# Altium footprint library Cyberdeck.PcbLib: 261 footprints (part 5 of 17)
Each footprint in its own frame and in the unit in brackets; x right, y up, seen from the top. Pads: shape width x height; smd on the part's side, far side on the other; paste and mask are expansions set on the pad; w line width, h text height; cw(c..) or ccw(c..) is an arc to the next point about the centre after c.
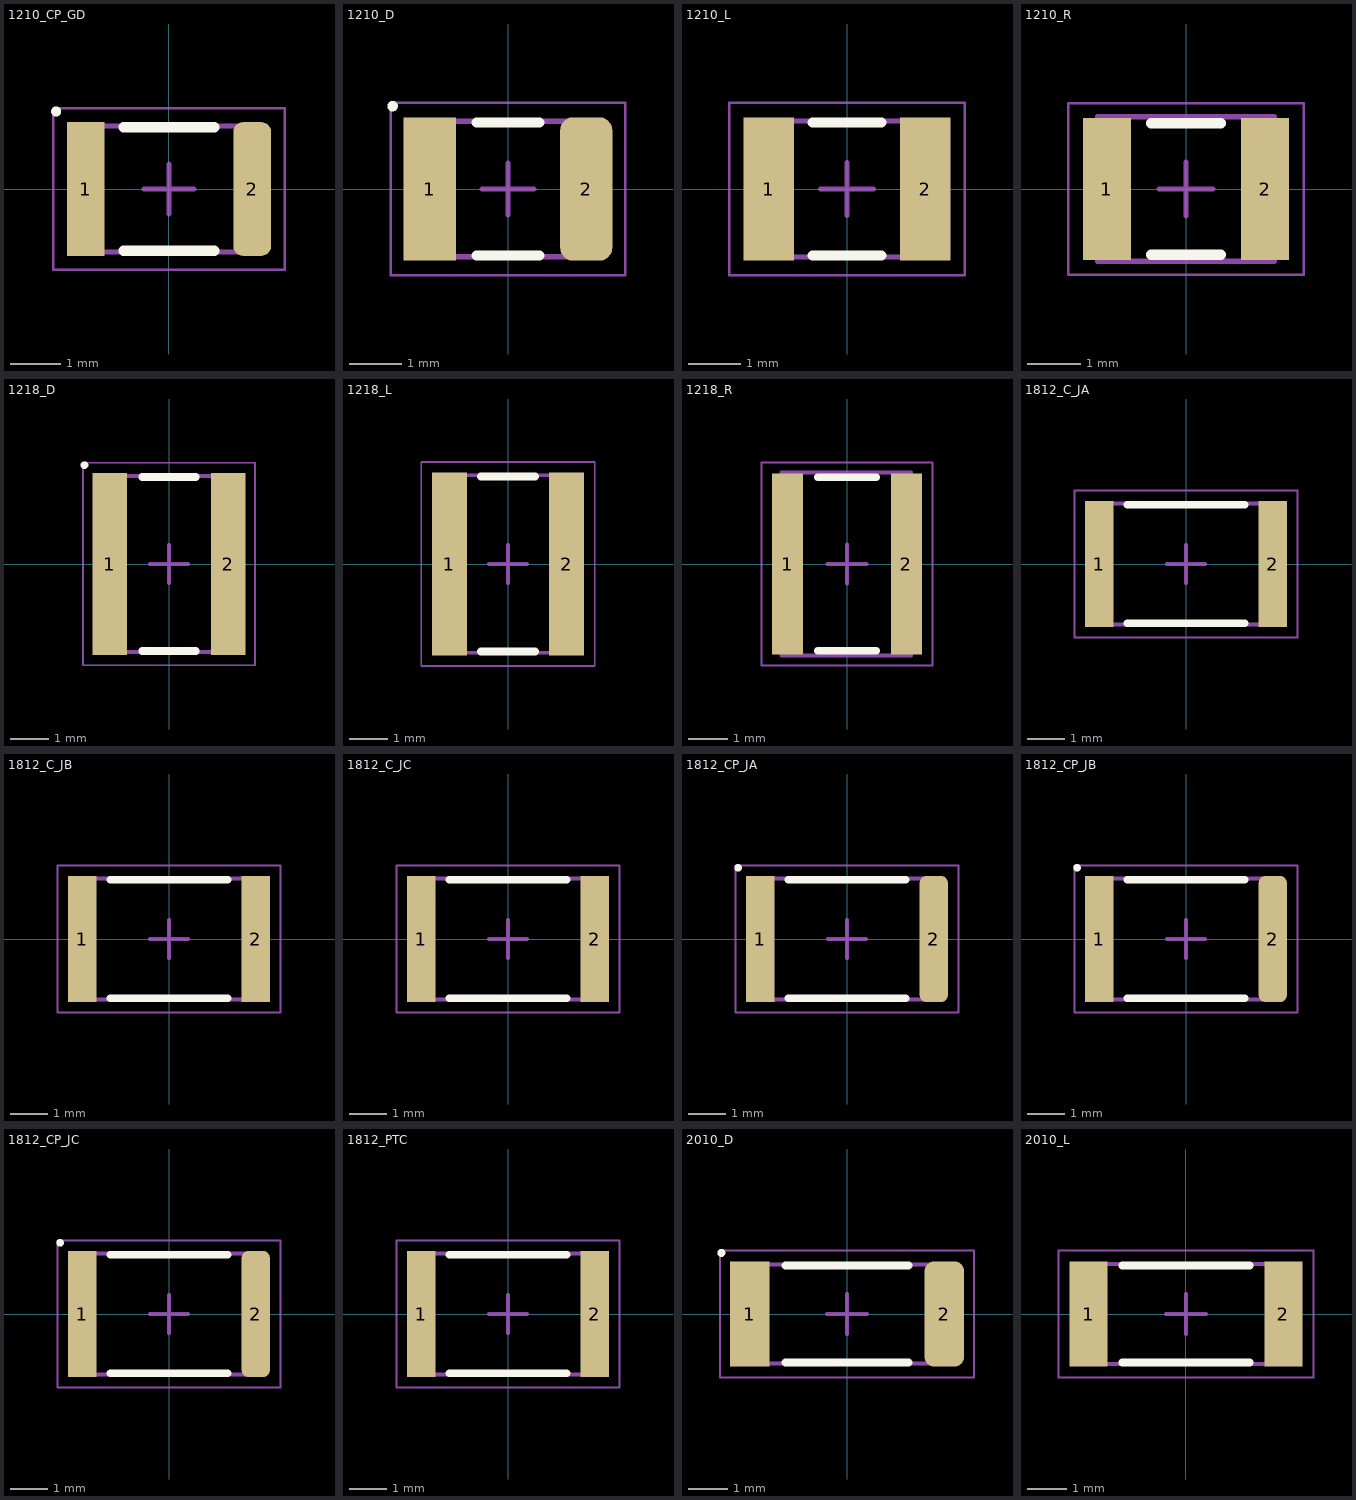
[diagram p4: the footprints below, top view; thin cyan lines are the x and y axes]

## 1210_CP_GD [mm] "1210_CP_GD"
height 2.5
pads (2):
  rect 0.75x2.65 smd: 1(-1.65,0)
  rrect50% 0.75x2.65 smd: 2(1.65,0)
Top Overlay:
  circle w0.1: c-2.237,1.537 r0.05
  lines w0.2: -0.9,-1.225 0.9,-1.225 ; -0.9,1.225 0.9,1.225
Assembly Top:
  lines w0.1: -1.6,-1.25 1.6,-1.25 1.6,1.25 -1.6,1.25 -1.6,-1.25
Courtyard Top:
  lines w0.05: -2.3,-1.6 2.3,-1.6 2.3,1.6 -2.3,1.6 -2.3,-1.6
  lines w0.1: -0.5,0 0.5,0 ; 0,-0.5 0,0.5
3D body: height 2.5, standoff 0, extent 1.35,-1.25 1.6,1.25
3D body: height 2.5, standoff 0, extent -1.6,-1.25 -1.35,1.25
3D body: height 2.5, standoff 0, extent -1.35,-1.25 1.35,1.25

## 1210_D [mm] "1210_D"
height 0.55
pads (2):
  rect 1x2.75 smd: 1(-1.5,0)
  rrect50% 1x2.75 smd: 2(1.5,0)
Top Overlay:
  circle w0.1: c-2.212,1.587 r0.05
  lines w0.2: -0.6,-1.275 0.6,-1.275 ; -0.6,1.275 0.6,1.275
Assembly Top:
  lines w0.1: -1.55,-1.3 1.55,-1.3 1.55,1.3 -1.55,1.3 -1.55,-1.3
Courtyard Top:
  lines w0.05: -2.25,-1.65 2.25,-1.65 2.25,1.65 -2.25,1.65 -2.25,-1.65
  lines w0.1: -0.5,0 0.5,0 ; 0,-0.5 0,0.5
3D body: height 0.55, standoff 0, extent 1.07,-1.3 1.55,1.3
3D body: height 0.55, standoff 0, extent -1.55,-1.3 -1.07,1.3
3D body: height 0.55, standoff 0, extent -1.07,-1.3 1.07,1.3

## 1210_L [mm] "1210_L"
height 0.55
pads (2):
  rect 0.96x2.74 smd: 1(-1.495,0) 2(1.495,0)
Top Overlay:
  lines w0.2: -0.65,-1.27 0.65,-1.27 ; -0.65,1.27 0.65,1.27
Assembly Top:
  lines w0.1: -1.55,-1.3 -1.55,1.3 1.55,1.3 1.55,-1.3 -1.55,-1.3
Courtyard Top:
  lines w0.05: -2.25,-1.65 -2.25,1.65 2.25,1.65 2.25,-1.65 -2.25,-1.65
  lines w0.1: -0.5,0 0.5,0 ; 0,-0.5 0,0.5
3D body: height 0.55, standoff 0, extent -1.07,-1.3 1.07,1.3
3D body: height 0.55, standoff 0, extent -1.55,-1.3 -1.07,1.3
3D body: height 0.55, standoff 0, extent 1.07,-1.3 1.55,1.3

## 1210_R [mm] "1210_R"
height 0.55
pads (2):
  rect 0.9x2.65 smd: 1(-1.475,0) 2(1.475,0)
Top Overlay:
  lines w0.2: -0.65,-1.225 0.65,-1.225 ; -0.65,1.225 0.65,1.225
Assembly Top:
  lines w0.1: -1.65,-1.35 1.65,-1.35 1.65,1.35 -1.65,1.35 -1.65,-1.35
Courtyard Top:
  lines w0.05: -2.2,-1.6 2.2,-1.6 2.2,1.6 -2.2,1.6 -2.2,-1.6
  lines w0.1: -0.5,0 0.5,0 ; 0,-0.5 0,0.5
3D body "RESC-1210.stp": height 0.6, standoff 0, extent -1.65,-1.35 1.65,1.35

## 1218_D [mm] "1218_D"
height 0.55
pads (2):
  rect 0.9x4.75 smd: 1(-1.55,0) 2(1.55,0)
Top Overlay:
  circle w0.1: c-2.212,2.587 r0.05
  lines w0.2: -0.7,-2.275 0.7,-2.275 ; -0.7,2.275 0.7,2.275
Assembly Top:
  lines w0.1: -1.55,-2.3 -1.55,2.3 1.55,2.3 1.55,-2.3 -1.55,-2.3
Courtyard Top:
  lines w0.05: -2.25,-2.65 -2.25,2.65 2.25,2.65 2.25,-2.65 -2.25,-2.65
  lines w0.1: -0.5,0 0.5,0 ; 0,-0.5 0,0.5
3D body: height 0.55, standoff 0, extent -1.12,-2.3 1.12,2.3
3D body: height 0.55, standoff 0, extent -1.55,-2.3 -1.12,2.3
3D body: height 0.55, standoff 0, extent 1.12,-2.3 1.55,2.3

## 1218_L [mm] "1218_L"
height 0.55
pads (2):
  rect 0.91x4.74 smd: 1(-1.52,0) 2(1.52,0)
Top Overlay:
  lines w0.2: -0.7,-2.27 0.7,-2.27 ; -0.7,2.27 0.7,2.27
Assembly Top:
  lines w0.1: -1.55,-2.3 1.55,-2.3 1.55,2.3 -1.55,2.3 -1.55,-2.3
Courtyard Top:
  lines w0.05: -2.25,-2.65 2.25,-2.65 2.25,2.65 -2.25,2.65 -2.25,-2.65
  lines w0.1: -0.5,0 0.5,0 ; 0,-0.5 0,0.5
3D body: height 0.55, standoff 0, extent 1.12,-2.3 1.55,2.3
3D body: height 0.55, standoff 0, extent -1.55,-2.3 -1.12,2.3
3D body: height 0.55, standoff 0, extent -1.12,-2.3 1.12,2.3

## 1218_R [mm] "1218_R"
height 0.55
pads (2):
  rect 0.8x4.65 smd: 1(-1.525,0) 2(1.525,0)
Top Overlay:
  lines w0.2: -0.75,-2.225 0.75,-2.225 ; -0.75,2.225 0.75,2.225
Assembly Top:
  lines w0.1: -1.676,-2.35 1.65,-2.35 1.65,2.35 -1.676,2.35 -1.676,-2.35
Courtyard Top:
  lines w0.05: -2.2,-2.6 2.2,-2.6 2.2,2.6 -2.2,2.6 -2.2,-2.6
  lines w0.1: -0.5,0 0.5,0 ; 0,-0.5 0,0.5
3D body "RESC-1218.stp": height 0.65, standoff 0, extent -1.65,-2.35 1.65,2.35

## 1812_C_JA [mm] "1812_C_JA"
height 0.85
pads (2):
  rect 0.75x3.35 smd: 1(-2.3,0) 2(2.3,0)
Top Overlay:
  lines w0.2: -1.55,-1.575 1.55,-1.575 ; -1.55,1.575 1.55,1.575
Assembly Top:
  lines w0.1: -2.25,-1.6 -2.25,1.6 2.25,1.6 2.25,-1.6 -2.25,-1.6
Courtyard Top:
  lines w0.05: -2.95,-1.95 -2.95,1.95 2.95,1.95 2.95,-1.95 -2.95,-1.95
  lines w0.1: -0.5,0 0.5,0 ; 0,-0.5 0,0.5
3D body: height 0.85, standoff 0, extent -2,-1.6 2,1.6
3D body: height 0.85, standoff 0, extent -2.25,-1.6 -2,1.6
3D body: height 0.85, standoff 0, extent 2,-1.6 2.25,1.6

## 1812_C_JB [mm] "1812_C_JB"
height 1.15
pads (2):
  rect 0.75x3.35 smd: 1(-2.3,0) 2(2.3,0)
Top Overlay:
  lines w0.2: -1.55,-1.575 1.55,-1.575 ; -1.55,1.575 1.55,1.575
Assembly Top:
  lines w0.1: -2.25,-1.6 2.25,-1.6 2.25,1.6 -2.25,1.6 -2.25,-1.6
Courtyard Top:
  lines w0.05: -2.95,-1.95 2.95,-1.95 2.95,1.95 -2.95,1.95 -2.95,-1.95
  lines w0.1: -0.5,0 0.5,0 ; 0,-0.5 0,0.5
3D body: height 1.15, standoff 0, extent 2,-1.6 2.25,1.6
3D body: height 1.15, standoff 0, extent -2.25,-1.6 -2,1.6
3D body: height 1.15, standoff 0, extent -2,-1.6 2,1.6

## 1812_C_JC [mm] "1812_C_JC"
height 1.6
pads (2):
  rect 0.75x3.35 smd: 1(-2.3,0) 2(2.3,0)
Top Overlay:
  lines w0.2: -1.55,-1.575 1.55,-1.575 ; -1.55,1.575 1.55,1.575
Assembly Top:
  lines w0.1: -2.25,-1.6 2.25,-1.6 2.25,1.6 -2.25,1.6 -2.25,-1.6
Courtyard Top:
  lines w0.05: -2.95,-1.95 2.95,-1.95 2.95,1.95 -2.95,1.95 -2.95,-1.95
  lines w0.1: -0.5,0 0.5,0 ; 0,-0.5 0,0.5
3D body: height 1.6, standoff 0, extent 2,-1.6 2.25,1.6
3D body: height 1.6, standoff 0, extent -2.25,-1.6 -2,1.6
3D body: height 1.6, standoff 0, extent -2,-1.6 2,1.6

## 1812_CP_JA [mm] "1812_CP_JA"
height 0.85
pads (2):
  rect 0.75x3.35 smd: 1(-2.3,0)
  rrect50% 0.75x3.35 smd: 2(2.3,0)
Top Overlay:
  circle w0.1: c-2.887,1.887 r0.05
  lines w0.2: -1.55,-1.575 1.55,-1.575 ; -1.55,1.575 1.55,1.575
Assembly Top:
  lines w0.1: -2.25,-1.6 -2.25,1.6 2.25,1.6 2.25,-1.6 -2.25,-1.6
Courtyard Top:
  lines w0.05: -2.95,-1.95 -2.95,1.95 2.95,1.95 2.95,-1.95 -2.95,-1.95
  lines w0.1: -0.5,0 0.5,0 ; 0,-0.5 0,0.5
3D body: height 0.85, standoff 0, extent -2,-1.6 2,1.6
3D body: height 0.85, standoff 0, extent -2.25,-1.6 -2,1.6
3D body: height 0.85, standoff 0, extent 2,-1.6 2.25,1.6

## 1812_CP_JB [mm] "1812_CP_JB"
height 1.15
pads (2):
  rect 0.75x3.35 smd: 1(-2.3,0)
  rrect50% 0.75x3.35 smd: 2(2.3,0)
Top Overlay:
  circle w0.1: c-2.887,1.887 r0.05
  lines w0.2: -1.55,-1.575 1.55,-1.575 ; -1.55,1.575 1.55,1.575
Assembly Top:
  lines w0.1: -2.25,-1.6 2.25,-1.6 2.25,1.6 -2.25,1.6 -2.25,-1.6
Courtyard Top:
  lines w0.05: -2.95,-1.95 2.95,-1.95 2.95,1.95 -2.95,1.95 -2.95,-1.95
  lines w0.1: -0.5,0 0.5,0 ; 0,-0.5 0,0.5
3D body: height 1.15, standoff 0, extent 2,-1.6 2.25,1.6
3D body: height 1.15, standoff 0, extent -2.25,-1.6 -2,1.6
3D body: height 1.15, standoff 0, extent -2,-1.6 2,1.6

## 1812_CP_JC [mm] "1812_CP_JC"
height 1.6
pads (2):
  rect 0.75x3.35 smd: 1(-2.3,0)
  rrect50% 0.75x3.35 smd: 2(2.3,0)
Top Overlay:
  circle w0.1: c-2.887,1.887 r0.05
  lines w0.2: -1.55,-1.575 1.55,-1.575 ; -1.55,1.575 1.55,1.575
Assembly Top:
  lines w0.1: -2.25,-1.6 2.25,-1.6 2.25,1.6 -2.25,1.6 -2.25,-1.6
Courtyard Top:
  lines w0.05: -2.95,-1.95 2.95,-1.95 2.95,1.95 -2.95,1.95 -2.95,-1.95
  lines w0.1: -0.5,0 0.5,0 ; 0,-0.5 0,0.5
3D body: height 1.6, standoff 0, extent 2,-1.6 2.25,1.6
3D body: height 1.6, standoff 0, extent -2.25,-1.6 -2,1.6
3D body: height 1.6, standoff 0, extent -2,-1.6 2,1.6

## 1812_PTC [mm] "1812_PTC"
height 1.25
pads (2):
  rect 0.75x3.35 smd: 1(-2.3,0) 2(2.3,0)
Top Overlay:
  lines w0.2: -1.55,-1.575 1.55,-1.575 ; -1.55,1.575 1.55,1.575
Assembly Top:
  lines w0.1: -2.25,-1.6 -2.25,1.6 2.25,1.6 2.25,-1.6 -2.25,-1.6
Courtyard Top:
  lines w0.05: -2.95,-1.95 -2.95,1.95 2.95,1.95 2.95,-1.95 -2.95,-1.95
  lines w0.1: -0.5,0 0.5,0 ; 0,-0.5 0,0.5
3D body: height 1.25, standoff 0, extent -2.25,-1.6 -2,1.6
3D body: height 1.25, standoff 0, extent 2,-1.6 2.25,1.6
3D body: height 1.25, standoff 0, extent -2,-1.6 2,1.6

## 2010_D [mm] "2010_D"
height 0.55
pads (2):
  rect 1x2.65 smd: 1(-2.45,0)
  rrect50% 1x2.65 smd: 2(2.45,0)
Top Overlay:
  circle w0.1: c-3.162,1.537 r0.05
  lines w0.2: -1.55,-1.225 1.55,-1.225 ; -1.55,1.225 1.55,1.225
Assembly Top:
  lines w0.1: -2.5,-1.25 -2.5,1.25 2.5,1.25 2.5,-1.25 -2.5,-1.25
Courtyard Top:
  lines w0.05: -3.2,-1.6 -3.2,1.6 3.2,1.6 3.2,-1.6 -3.2,-1.6
  lines w0.1: -0.5,0 0.5,0 ; 0,-0.5 0,0.5
3D body: height 0.55, standoff 0, extent -2.02,-1.25 2.02,1.25
3D body: height 0.55, standoff 0, extent -2.5,-1.25 -2.02,1.25
3D body: height 0.55, standoff 0, extent 2.02,-1.25 2.5,1.25

## 2010_L [mm] "2010_L"
height 0.55
pads (2):
  rect 0.96x2.64 smd: 1(-2.445,0) 2(2.445,0)
Top Overlay:
  lines w0.2: -1.6,-1.22 1.6,-1.22 ; -1.6,1.22 1.6,1.22
Assembly Top:
  lines w0.1: -2.5,-1.25 -2.5,1.25 2.5,1.25 2.5,-1.25 -2.5,-1.25
Courtyard Top:
  lines w0.05: -3.2,-1.6 -3.2,1.6 3.2,1.6 3.2,-1.6 -3.2,-1.6
  lines w0.1: -0.5,0 0.5,0 ; 0,-0.5 0,0.5
3D body: height 0.55, standoff 0, extent -2.02,-1.25 2.02,1.25
3D body: height 0.55, standoff 0, extent -2.5,-1.25 -2.02,1.25
3D body: height 0.55, standoff 0, extent 2.02,-1.25 2.5,1.25